# Altium footprint library PcbLib_ICs.PcbLib: 317 footprints (part 23 of 24) (continued)
## VQFN-24 [mm] "VQFN-24 package 5.5x3.5mm with 0.5mm pitch"
height 0.75
pads (25):
  rect 0.25x0.6 smd paste+0 mask+0.05: 1(-0.75,2.65)
  rrect50% 0.6x0.25 smd paste+0 mask+0.05: 2(-1.65,2.25) 3(-1.65,1.75) 4(-1.65,1.25) 5(-1.65,0.75) 6(-1.65,0.25) 7(-1.65,-0.25) 8(-1.65,-0.75) 9(-1.65,-1.25) 10(-1.65,-1.75) 11(-1.65,-2.25) 14(1.65,-2.25) 15(1.65,-1.75) 16(1.65,-1.25) 17(1.65,-0.75) 18(1.65,-0.25) 19(1.65,0.25) 20(1.65,0.75) 21(1.65,1.25) 22(1.65,1.75) 23(1.65,2.25)
  rrect50% 0.25x0.6 smd paste+0 mask+0.05: 12(-0.75,-2.65) 13(0.75,-2.65) 24(0.75,2.65)
  rrect5% 2.05x4.05 smd paste-10 mask+0.05: EP(0,0)
via 0.545,-1.498 diameter 0.7 hole 0.3
via -0.55,-1.5 diameter 0.7 hole 0.3
via -0.55,1.5 diameter 0.7 hole 0.3
via 0.55,1.5 diameter 0.7 hole 0.3
via 0.545,-0.748 diameter 0.7 hole 0.3
via -0.55,-0.75 diameter 0.7 hole 0.3
via 0.55,0.75 diameter 0.7 hole 0.3
via -0.55,0.75 diameter 0.7 hole 0.3
via 0,0 diameter 0.7 hole 0.3
Top Layer:
  region: 0.375,-2.9 0.375,-2.91 0.367,-2.928 0.353,-2.942 0.335,-2.95 0.325,-2.95 0.225,-2.95 0.215,-2.95 0.197,-2.942 0.183,-2.928 0.175,-2.91 0.175,-2.9 0.175,-2.475 0.174,-2.465 0.167,-2.447 0.153,-2.433 0.135,-2.426 0.125,-2.425 -0.125,-2.425 -0.135,-2.426 -0.153,-2.433 -0.167,-2.447 -0.174,-2.465 -0.175,-2.475 -0.175,-2.9 -0.175,-2.91 -0.183,-2.928 -0.197,-2.942 -0.215,-2.95 -0.225,-2.95 -0.325,-2.95 -0.335,-2.95 -0.353,-2.942 -0.367,-2.928 -0.375,-2.91 -0.375,-2.9 -0.375,-2.075 -0.376,-2.065 -0.383,-2.047 -0.397,-2.033 -0.415,-2.026 -0.425,-2.025 -0.425,-1.95 0.425,-1.95 0.425,-2.025 0.415,-2.026 0.397,-2.033 0.383,-2.047 0.376,-2.065 0.375,-2.075
  region: -0.375,2.9 -0.375,2.91 -0.367,2.928 -0.353,2.942 -0.335,2.95 -0.325,2.95 -0.225,2.95 -0.215,2.95 -0.197,2.942 -0.183,2.928 -0.175,2.91 -0.175,2.9 -0.175,2.475 -0.174,2.465 -0.167,2.447 -0.153,2.433 -0.135,2.426 -0.125,2.425 0.125,2.425 0.135,2.426 0.153,2.433 0.167,2.447 0.174,2.465 0.175,2.475 0.175,2.9 0.175,2.91 0.183,2.928 0.197,2.942 0.215,2.95 0.225,2.95 0.325,2.95 0.335,2.95 0.353,2.942 0.367,2.928 0.375,2.91 0.375,2.9 0.375,2.075 0.376,2.065 0.383,2.047 0.397,2.033 0.415,2.026 0.425,2.025 0.425,1.95 -0.425,1.95 -0.425,2.025 -0.415,2.026 -0.397,2.033 -0.383,2.047 -0.376,2.065 -0.375,2.075
Top Overlay:
  circle w0.25: c-1.65,3.5 r0.125
  lines w0.2: -2,-2.7 -2,-3 -1.2,-3 ; -2,2.7 -2,3 -1.2,3 ; 1.2,-3 2,-3 2,-2.7 ; 1.2,3 2,3 2,2.7
Top Paste:
  rectangle: -0.25,0.1 0.25,0.6
  rectangle: 0.45,0.1 0.95,0.6
  region: -0.45,0.6 -0.95,0.6 -0.95,0.1 -0.45,0.1
  rectangle: -0.25,0.8 0.25,1.3
  rectangle: 0.45,0.8 0.95,1.3
  region: -0.45,1.3 -0.95,1.3 -0.95,0.8 -0.45,0.8
  rectangle: -0.25,1.5 0.25,2
  rectangle: 0.45,1.5 0.95,2
  region: -0.45,2 -0.95,2 -0.95,1.5 -0.45,1.5
  region: 0.25,-0.1 -0.25,-0.1 -0.25,-0.6 0.25,-0.6
  region: -0.45,-0.1 -0.95,-0.1 -0.95,-0.6 -0.45,-0.6
  rectangle: 0.45,-0.6 0.95,-0.1
  region: 0.25,-0.8 -0.25,-0.8 -0.25,-1.3 0.25,-1.3
  region: -0.45,-0.8 -0.95,-0.8 -0.95,-1.3 -0.45,-1.3
  rectangle: 0.45,-1.3 0.95,-0.8
  region: 0.25,-1.5 -0.25,-1.5 -0.25,-2 0.25,-2
  region: -0.45,-1.5 -0.95,-1.5 -0.95,-2 -0.45,-2
  rectangle: 0.45,-2 0.95,-1.5
  region: -0.375,-2.9 -0.375,-2.91 -0.367,-2.928 -0.353,-2.942 -0.335,-2.95 -0.325,-2.95 -0.225,-2.95 -0.215,-2.95 -0.197,-2.942 -0.183,-2.928 -0.175,-2.91 -0.175,-2.9 -0.175,-2.4 -0.175,-2.39 -0.183,-2.372 -0.197,-2.358 -0.215,-2.35 -0.225,-2.35 -0.325,-2.35 -0.335,-2.35 -0.353,-2.358 -0.367,-2.372 -0.375,-2.39 -0.375,-2.4
  region: 0.375,-2.9 0.375,-2.91 0.367,-2.928 0.353,-2.942 0.335,-2.95 0.325,-2.95 0.225,-2.95 0.215,-2.95 0.197,-2.942 0.183,-2.928 0.175,-2.91 0.175,-2.9 0.175,-2.4 0.175,-2.39 0.183,-2.372 0.197,-2.358 0.215,-2.35 0.225,-2.35 0.325,-2.35 0.335,-2.35 0.353,-2.358 0.367,-2.372 0.375,-2.39 0.375,-2.4
  region: 0.375,2.9 0.375,2.91 0.367,2.928 0.353,2.942 0.335,2.95 0.325,2.95 0.225,2.95 0.215,2.95 0.197,2.942 0.183,2.928 0.175,2.91 0.175,2.9 0.175,2.4 0.175,2.39 0.183,2.372 0.197,2.358 0.215,2.35 0.225,2.35 0.325,2.35 0.335,2.35 0.353,2.358 0.367,2.372 0.375,2.39 0.375,2.4
  region: -0.375,2.9 -0.375,2.91 -0.367,2.928 -0.353,2.942 -0.335,2.95 -0.325,2.95 -0.225,2.95 -0.215,2.95 -0.197,2.942 -0.183,2.928 -0.175,2.91 -0.175,2.9 -0.175,2.4 -0.175,2.39 -0.183,2.372 -0.197,2.358 -0.215,2.35 -0.225,2.35 -0.325,2.35 -0.335,2.35 -0.353,2.358 -0.367,2.372 -0.375,2.39 -0.375,2.4
Top Solder:
  region: 0.225,-3 0.205,-3 0.168,-2.985 0.14,-2.957 0.125,-2.92 0.125,-2.9 0.125,-2.5 0.125,-2.495 0.121,-2.486 0.114,-2.479 0.105,-2.475 0.1,-2.475 -0.1,-2.475 -0.105,-2.475 -0.114,-2.479 -0.121,-2.486 -0.125,-2.495 -0.125,-2.5 -0.125,-2.9 -0.125,-2.92 -0.14,-2.957 -0.168,-2.985 -0.205,-3 -0.225,-3 -0.35,-3 -0.365,-3 -0.392,-2.989 -0.414,-2.967 -0.425,-2.94 -0.425,-2.925 -0.425,-2.15 -0.426,-2.135 -0.438,-2.108 -0.458,-2.088 -0.485,-2.076 -0.5,-2.075 -0.5,-2 0.5,-2 0.501,-2.075 0.486,-2.076 0.459,-2.087 0.438,-2.108 0.426,-2.135 0.425,-2.15 0.425,-2.925 0.425,-2.94 0.414,-2.967 0.392,-2.989 0.365,-3 0.35,-3
  region: -0.225,3 -0.205,3 -0.168,2.985 -0.14,2.957 -0.125,2.92 -0.125,2.9 -0.125,2.5 -0.125,2.495 -0.121,2.486 -0.114,2.479 -0.105,2.475 -0.1,2.475 0.1,2.475 0.105,2.475 0.114,2.479 0.121,2.486 0.125,2.495 0.125,2.5 0.125,2.9 0.125,2.92 0.14,2.957 0.168,2.985 0.205,3 0.225,3 0.35,3 0.365,3 0.392,2.989 0.414,2.967 0.425,2.94 0.425,2.925 0.425,2.15 0.426,2.135 0.438,2.108 0.458,2.088 0.485,2.076 0.5,2.075 0.5,2 -0.5,2 -0.501,2.075 -0.486,2.076 -0.459,2.087 -0.438,2.108 -0.426,2.135 -0.425,2.15 -0.425,2.925 -0.425,2.94 -0.414,2.967 -0.392,2.989 -0.365,3 -0.35,3
Bottom Solder:
  region: -1.2,2 -0.3,2 0,1.7 0.3,2 1.2,2 1.2,0.3 0.9,0 1.2,-0.3 1.2,-2 0.3,-2 0,-1.7 -0.3,-2 -1.2,-2 -1.2,-0.3 -0.9,0 -1.2,0.3
Top Assy:
  circle w0.05: c-1.25,2.248 r0.25
  lines w0.05: -1.75,-2.4 -1.76,-2.4 -1.76,-2.1 -1.75,-2.1 ; -1.75,-1.9 -1.76,-1.9 -1.76,-1.6 -1.75,-1.6 ; -1.75,-1.4 -1.76,-1.4 -1.76,-1.1 -1.75,-1.1 ; -1.75,-0.9 -1.76,-0.9 -1.76,-0.6 -1.75,-0.6 ; -1.75,-0.4 -1.76,-0.4 -1.76,-0.1 -1.75,-0.1 ; -1.75,0.1 -1.76,0.1 -1.76,0.4 -1.75,0.4 ; -1.75,0.6 -1.76,0.6 -1.76,0.9 -1.75,0.9 ; -1.75,1.1 -1.76,1.1 -1.76,1.4 -1.75,1.4 ; -1.75,1.6 -1.76,1.6 -1.76,1.9 -1.75,1.9 ; -1.75,2.1 -1.76,2.1 -1.76,2.4 -1.75,2.4 ; -1.45,-2.75 -1.45,-2.76 -1.2,-2.76 -1.2,-2.75 ; -1.45,2.75 -1.45,2.76 -1.2,2.76 -1.2,2.75 ; -0.9,-2.75 -0.9,-2.76 -0.6,-2.76 -0.6,-2.75 ; -0.9,2.75 -0.9,2.76 -0.6,2.76 -0.6,2.75 ; -0.375,-2.75 -0.375,-2.76 -0.175,-2.76 -0.175,-2.75 ; -0.375,2.75 -0.375,2.76 -0.175,2.76 -0.175,2.75 ; 0.175,-2.75 0.175,-2.76 0.375,-2.76 0.375,-2.75 ; 0.175,2.75 0.175,2.76 0.375,2.76 0.375,2.75 ; 0.6,-2.75 0.6,-2.76 0.9,-2.76 0.9,-2.75 ; 0.6,2.75 0.6,2.76 0.9,2.76 0.9,2.75 ; 1.2,-2.75 1.2,-2.76 1.45,-2.76 1.45,-2.75 ; 1.2,2.75 1.2,2.76 1.45,2.76 1.45,2.75 ; 1.75,-2.4 1.76,-2.4 1.76,-2.1 1.75,-2.1 ; 1.75,-1.9 1.76,-1.9 1.76,-1.6 1.75,-1.6 ; 1.75,-1.4 1.76,-1.4 1.76,-1.1 1.75,-1.1 ; 1.75,-0.9 1.76,-0.9 1.76,-0.6 1.75,-0.6 ; 1.75,-0.4 1.76,-0.4 1.76,-0.1 1.75,-0.1 ; 1.75,0.1 1.76,0.1 1.76,0.4 1.75,0.4 ; 1.75,0.6 1.76,0.6 1.76,0.9 1.75,0.9 ; 1.75,1.1 1.76,1.1 1.76,1.4 1.75,1.4 ; 1.75,1.6 1.76,1.6 1.76,1.9 1.75,1.9 ; 1.75,2.1 1.76,2.1 1.76,2.4 1.75,2.4 ; -1.75,-2.75 -1.75,2.75 1.75,2.75 1.75,-2.75 -1.75,-2.75
  text ".Designator" at 0.467,-3.443 h2
Top Text:
  lines w0.05: -2.1,-3.1 -2.1,3.1 2.1,3.1 2.1,-3.1 -2.1,-3.1
  lines w0.1: -0.5,0 0.5,0 ; 0,-0.5 0,0.5
3D body "VQFN-24.STEP": height 1, standoff 0, extent -1.76,-2.76 1.76,2.76

## VQFN-64_5LX [mm] "QFN64 9mm x 9mm, 0.5mm pitch"
height 1
pads (65):
  rect 0.95x0.25 smd paste+0 mask+0.05: 1(-4.45,3.75)
  oval 0.95x0.25 smd paste+0 mask+0.05: 2(-4.45,3.25) 3(-4.45,2.75) 4(-4.45,2.25) 5(-4.45,1.75) 6(-4.45,1.25) 7(-4.45,0.75) 8(-4.45,0.25) 9(-4.45,-0.25) 10(-4.45,-0.75) 11(-4.45,-1.25) 12(-4.45,-1.75) 13(-4.45,-2.25) 14(-4.45,-2.75) 15(-4.45,-3.25) 16(-4.45,-3.75) 33(4.45,-3.75) 34(4.45,-3.25) 35(4.45,-2.75) 36(4.45,-2.25) 37(4.45,-1.75) 38(4.45,-1.25) 39(4.45,-0.75) 40(4.45,-0.25) 41(4.45,0.25) 42(4.45,0.75) 43(4.45,1.25) 44(4.45,1.75) 45(4.45,2.25) 46(4.45,2.75) 47(4.45,3.25) 48(4.45,3.75)
  oval 0.25x0.95 smd paste+0 mask+0.05: 17(-3.75,-4.45) 18(-3.25,-4.45) 19(-2.75,-4.45) 20(-2.25,-4.45) 21(-1.75,-4.45) 22(-1.25,-4.45) 23(-0.75,-4.45) 24(-0.25,-4.45) 25(0.25,-4.45) 26(0.75,-4.45) 27(1.25,-4.45) 28(1.75,-4.45) 29(2.25,-4.45) 30(2.75,-4.45) 31(3.25,-4.45) 32(3.75,-4.45) 49(3.75,4.45) 50(3.25,4.45) 51(2.75,4.45) 52(2.25,4.45) 53(1.75,4.45) 54(1.25,4.45) 55(0.75,4.45) 56(0.25,4.45) 57(-0.25,4.45) 58(-0.75,4.45) 59(-1.25,4.45) 60(-1.75,4.45) 61(-2.25,4.45) 62(-2.75,4.45) 63(-3.25,4.45) 64(-3.75,4.45)
  rrect5% 5.5x5.5 smd paste-50 mask+0.05: EP(0,0)
via 0,-1.2 diameter 0.7 hole 0.3
via -1.2,-1.2 diameter 0.7 hole 0.3
via -2.4,-1.2 diameter 0.7 hole 0.3
via -2.4,-2.4 diameter 0.7 hole 0.3
via -1.2,-2.4 diameter 0.7 hole 0.3
via 0,-2.4 diameter 0.7 hole 0.3
via 2.4,-1.2 diameter 0.7 hole 0.3
via 1.2,-1.2 diameter 0.7 hole 0.3
via 1.2,-2.4 diameter 0.7 hole 0.3
via 2.4,-2.4 diameter 0.7 hole 0.3
via 2.4,2.4 diameter 0.7 hole 0.3
via 1.2,2.4 diameter 0.7 hole 0.3
via 1.2,1.2 diameter 0.7 hole 0.3
via 2.4,1.2 diameter 0.7 hole 0.3
via 1.2,0 diameter 0.7 hole 0.3
via 2.4,0 diameter 0.7 hole 0.3
via 0,2.4 diameter 0.7 hole 0.3
via -1.2,2.4 diameter 0.7 hole 0.3
via -2.4,2.4 diameter 0.7 hole 0.3
via -2.4,1.2 diameter 0.7 hole 0.3
via -1.2,1.2 diameter 0.7 hole 0.3
via 0,1.2 diameter 0.7 hole 0.3
via -2.4,0 diameter 0.7 hole 0.3
via -1.2,0 diameter 0.7 hole 0.3
via 0,0 diameter 0.7 hole 0.3
Top Overlay:
  circle w0.25: c-5.375,4.575 r0.125
  lines w0.2: -4.725,-4.275 -4.725,-4.725 -4.275,-4.725 ; -4.725,4.275 -4.725,4.725 -4.275,4.725 ; 4.275,-4.725 4.725,-4.725 4.725,-4.275 ; 4.275,4.725 4.725,4.725 4.725,4.275
Top Paste:
  region: 1.5,-0.8 1.5,-1.3 2,-1.3 2,-0.8
  region: 0.8,-0.8 0.8,-1.3 1.3,-1.3 1.3,-0.8
  region: 1.3,-2 1.3,-1.5 0.8,-1.5 0.8,-2
  region: 2,-2 2,-1.5 1.5,-1.5 1.5,-2
  region: -1.3,-0.8 -1.3,-1.3 -0.8,-1.3 -0.8,-0.8
  region: -2,-0.8 -2,-1.3 -1.5,-1.3 -1.5,-0.8
  region: -1.5,-2 -1.5,-1.5 -2,-1.5 -2,-2
  region: -0.8,-2 -0.8,-1.5 -1.3,-1.5 -1.3,-2
  region: 0.1,-0.8 0.1,-1.3 0.6,-1.3 0.6,-0.8
  region: -0.6,-0.8 -0.6,-1.3 -0.1,-1.3 -0.1,-0.8
  region: -0.1,-2 -0.1,-1.5 -0.6,-1.5 -0.6,-2
  region: 0.6,-2 0.6,-1.5 0.1,-1.5 0.1,-2
  region: 1.5,2 1.5,1.5 2,1.5 2,2
  region: 0.8,2 0.8,1.5 1.3,1.5 1.3,2
  region: 1.3,0.8 1.3,1.3 0.8,1.3 0.8,0.8
  region: 2,0.8 2,1.3 1.5,1.3 1.5,0.8
  region: -1.3,2 -1.3,1.5 -0.8,1.5 -0.8,2
  region: -2,2 -2,1.5 -1.5,1.5 -1.5,2
  region: -1.5,0.8 -1.5,1.3 -2,1.3 -2,0.8
  region: -0.8,0.8 -0.8,1.3 -1.3,1.3 -1.3,0.8
  region: 0.1,2 0.1,1.5 0.6,1.5 0.6,2
  region: -0.6,2 -0.6,1.5 -0.1,1.5 -0.1,2
  region: -0.1,0.8 -0.1,1.3 -0.6,1.3 -0.6,0.8
  region: 0.6,0.8 0.6,1.3 0.1,1.3 0.1,0.8
  region: 1.5,0.6 1.5,0.1 2,0.1 2,0.6
  region: 0.8,0.6 0.8,0.1 1.3,0.1 1.3,0.6
  region: 1.3,-0.6 1.3,-0.1 0.8,-0.1 0.8,-0.6
  region: 2,-0.6 2,-0.1 1.5,-0.1 1.5,-0.6
  region: -1.3,0.6 -1.3,0.1 -0.8,0.1 -0.8,0.6
  region: -2,0.6 -2,0.1 -1.5,0.1 -1.5,0.6
  region: -1.5,-0.6 -1.5,-0.1 -2,-0.1 -2,-0.6
  region: -0.8,-0.6 -0.8,-0.1 -1.3,-0.1 -1.3,-0.6
  region: 0.1,0.6 0.1,0.1 0.6,0.1 0.6,0.6
  region: -0.6,0.6 -0.6,0.1 -0.1,0.1 -0.1,0.6
  region: -0.1,-0.6 -0.1,-0.1 -0.6,-0.1 -0.6,-0.6
  region: 0.6,-0.6 0.6,-0.1 0.1,-0.1 0.1,-0.6
Bottom Solder:
  region: -3,3 -0.2,3 0,2.8 0.2,3 3,3.001 3,0.2 2.8,0 3,-0.2 3,-3 0.2,-3 0,-2.8 -0.2,-3 -3,-3 -3,-0.2 -2.8,0 -3,0.2
Top Assy:
  drawing of 197 lines, arcs and shapes, not listed
  text ".Designator" at -3.443,-0.467 h2
Top Text:
  lines w0.05: -4.875,-4.875 -4.875,4.875 4.875,4.875 4.875,-4.875 -4.875,-4.875
  lines w0.1: -0.5,0 0.5,0 ; 0,-0.5 0,0.5
3D body "VQFN64_5LX.SLDPRT": height 1, standoff 0, extent -4.52,-4.52 4.52,4.52

## VQFN-64_R4X [mm] "QFN64 9mm x 9mm, 0.5mm pitch"
height 1
pads (65):
  rect 0.95x0.25 smd paste+0 mask+0.05: 1(-4.5,3.75)
  oval 0.95x0.25 smd paste+0 mask+0.05: 2(-4.5,3.25) 3(-4.5,2.75) 4(-4.5,2.25) 5(-4.5,1.75) 6(-4.5,1.25) 7(-4.5,0.75) 8(-4.5,0.25) 9(-4.5,-0.25) 10(-4.5,-0.75) 11(-4.5,-1.25) 12(-4.5,-1.75) 13(-4.5,-2.25) 14(-4.5,-2.75) 15(-4.5,-3.25) 16(-4.5,-3.75) 33(4.5,-3.75) 34(4.5,-3.25) 35(4.5,-2.75) 36(4.5,-2.25) 37(4.5,-1.75) 38(4.5,-1.25) 39(4.5,-0.75) 40(4.5,-0.25) 41(4.5,0.25) 42(4.5,0.75) 43(4.5,1.25) 44(4.5,1.75) 45(4.5,2.25) 46(4.5,2.75) 47(4.5,3.25) 48(4.5,3.75)
  oval 0.25x0.95 smd paste+0 mask+0.05: 17(-3.75,-4.5) 18(-3.25,-4.5) 19(-2.75,-4.5) 20(-2.25,-4.5) 21(-1.75,-4.5) 22(-1.25,-4.5) 23(-0.75,-4.5) 24(-0.25,-4.5) 25(0.25,-4.5) 26(0.75,-4.5) 27(1.25,-4.5) 28(1.75,-4.5) 29(2.25,-4.5) 30(2.75,-4.5) 31(3.25,-4.5) 32(3.75,-4.5) 49(3.75,4.5) 50(3.25,4.5) 51(2.75,4.5) 52(2.25,4.5) 53(1.75,4.5) 54(1.25,4.5) 55(0.75,4.5) 56(0.25,4.5) 57(-0.25,4.5) 58(-0.75,4.5) 59(-1.25,4.5) 60(-1.75,4.5) 61(-2.25,4.5) 62(-2.75,4.5) 63(-3.25,4.5) 64(-3.75,4.5)
  rrect5% 7.25x7.25 smd paste-50 mask+0.05: EP(0,0)
via -0.6,0.6 diameter 0.7 hole 0.3
via -1.8,0.6 diameter 0.7 hole 0.3
via -3,0.6 diameter 0.7 hole 0.3
via -0.6,1.8 diameter 0.7 hole 0.3
via -1.8,1.8 diameter 0.7 hole 0.3
via -3,1.8 diameter 0.7 hole 0.3
via -3,3 diameter 0.7 hole 0.3
via -1.8,3 diameter 0.7 hole 0.3
via -0.6,3 diameter 0.7 hole 0.3
via 3,0.6 diameter 0.7 hole 0.3
via 1.8,0.6 diameter 0.7 hole 0.3
via 0.6,0.6 diameter 0.7 hole 0.3
via 3,1.8 diameter 0.7 hole 0.3
via 1.8,1.8 diameter 0.7 hole 0.3
via 0.6,1.8 diameter 0.7 hole 0.3
via 0.6,3 diameter 0.7 hole 0.3
via 1.8,3 diameter 0.7 hole 0.3
via 3,3 diameter 0.7 hole 0.3
via 3,-3 diameter 0.7 hole 0.3
via 1.8,-3 diameter 0.7 hole 0.3
via 0.6,-3 diameter 0.7 hole 0.3
via 3,-1.8 diameter 0.7 hole 0.3
via 1.8,-1.8 diameter 0.7 hole 0.3
via 0.6,-1.8 diameter 0.7 hole 0.3
via 0.6,-0.6 diameter 0.7 hole 0.3
via 1.8,-0.6 diameter 0.7 hole 0.3
via 3,-0.6 diameter 0.7 hole 0.3
via -0.6,-3 diameter 0.7 hole 0.3
via -1.8,-3 diameter 0.7 hole 0.3
via -3,-3 diameter 0.7 hole 0.3
via -0.6,-1.8 diameter 0.7 hole 0.3
via -1.8,-1.8 diameter 0.7 hole 0.3
via -3,-1.8 diameter 0.7 hole 0.3
via -3,-0.6 diameter 0.7 hole 0.3
via -1.8,-0.6 diameter 0.7 hole 0.3
via -0.6,-0.6 diameter 0.7 hole 0.3
Top Overlay:
  circle w0.25: c-5.375,4.575 r0.125
  lines w0.2: -4.725,-4.275 -4.725,-4.725 -4.275,-4.725 ; -4.725,4.275 -4.725,4.725 -4.275,4.725 ; 4.275,-4.725 4.725,-4.725 4.725,-4.275 ; 4.275,4.725 4.725,4.725 4.725,4.275
Top Paste:
  region: 0.6,-0.6 0.6,-0.1 0.1,-0.1 0.1,-0.6
  region: -0.1,-0.6 -0.1,-0.1 -0.6,-0.1 -0.6,-0.6
  region: -0.6,0.6 -0.6,0.1 -0.1,0.1 -0.1,0.6
  region: 0.1,0.6 0.1,0.1 0.6,0.1 0.6,0.6
  region: -0.8,-0.6 -0.8,-0.1 -1.3,-0.1 -1.3,-0.6
  region: -1.5,-0.6 -1.5,-0.1 -2,-0.1 -2,-0.6
  region: -2,0.6 -2,0.1 -1.5,0.1 -1.5,0.6
  region: -1.3,0.6 -1.3,0.1 -0.8,0.1 -0.8,0.6
  region: 2,-0.6 2,-0.1 1.5,-0.1 1.5,-0.6
  region: 1.3,-0.6 1.3,-0.1 0.8,-0.1 0.8,-0.6
  region: 0.8,0.6 0.8,0.1 1.3,0.1 1.3,0.6
  region: 1.5,0.6 1.5,0.1 2,0.1 2,0.6
  region: 0.6,0.8 0.6,1.3 0.1,1.3 0.1,0.8
  region: -0.1,0.8 -0.1,1.3 -0.6,1.3 -0.6,0.8
  region: -0.6,2 -0.6,1.5 -0.1,1.5 -0.1,2
  region: 0.1,2 0.1,1.5 0.6,1.5 0.6,2
  region: -0.8,0.8 -0.8,1.3 -1.3,1.3 -1.3,0.8
  region: -1.5,0.8 -1.5,1.3 -2,1.3 -2,0.8
  region: -2,2 -2,1.5 -1.5,1.5 -1.5,2
  region: -1.3,2 -1.3,1.5 -0.8,1.5 -0.8,2
  region: 2,0.8 2,1.3 1.5,1.3 1.5,0.8
  region: 1.3,0.8 1.3,1.3 0.8,1.3 0.8,0.8
  region: 0.8,2 0.8,1.5 1.3,1.5 1.3,2
  region: 1.5,2 1.5,1.5 2,1.5 2,2
  region: 0.6,-2 0.6,-1.5 0.1,-1.5 0.1,-2
  region: -0.1,-2 -0.1,-1.5 -0.6,-1.5 -0.6,-2
  region: -0.6,-0.8 -0.6,-1.3 -0.1,-1.3 -0.1,-0.8
  region: 0.1,-0.8 0.1,-1.3 0.6,-1.3 0.6,-0.8
  region: -0.8,-2 -0.8,-1.5 -1.3,-1.5 -1.3,-2
  region: -1.5,-2 -1.5,-1.5 -2,-1.5 -2,-2
  region: -2,-0.8 -2,-1.3 -1.5,-1.3 -1.5,-0.8
  region: -1.3,-0.8 -1.3,-1.3 -0.8,-1.3 -0.8,-0.8
  region: 2,-2 2,-1.5 1.5,-1.5 1.5,-2
  region: 1.3,-2 1.3,-1.5 0.8,-1.5 0.8,-2
  region: 0.8,-0.8 0.8,-1.3 1.3,-1.3 1.3,-0.8
  region: 1.5,-0.8 1.5,-1.3 2,-1.3 2,-0.8
Bottom Solder:
  region: -3.5,3.5 -0.4,3.5 0,3.1 0.4,3.5 3.5,3.501 3.5,0.4 3.1,0 3.499,-0.4 3.499,-3.5 0.4,-3.5 0,-3.1 -0.4,-3.5 -3.5,-3.499 -3.5,-0.4 -3.1,0 -3.5,0.4
Top Assy:
  drawing of 197 lines, arcs and shapes, not listed
  text ".Designator" at -3.443,-0.467 h2
Top Text:
  lines w0.05: -4.875,-4.875 4.875,-4.875 4.875,4.875 -4.875,4.875 -4.875,-4.875
  lines w0.1: -0.5,0 0.5,0 ; 0,-0.5 0,0.5
3D body "VQFN64_R4X.STEP": height 0.9, standoff 0, extent -4.52,-4.52 4.52,4.52

## VQFN-HR-11 [mm] "VQFN-HR-11 package with 0.5mm pitch"
height 0.75
pads (11):
  rect 2.6x0.25 smd paste-3 mask+0.05: 1(0,0.5)
  rrect50% 2.6x0.25 smd paste-3 mask+0.05: 2(0,0) 3(0,-0.5)
  rrect50% 0.25x0.7 smd paste+0 mask+0.05: 4(-0.75,-1.45) 5(-0.25,-1.45) 6(0.25,-1.45) 7(0.75,-1.45) 8(0.75,1.45) 9(0.25,1.45) 10(-0.25,1.45) 11(-0.75,1.45)
Top Overlay:
  circle w0.25: c-1.6,0.5 r0.125
  lines w0.2: -1.3,-1.5 -1.3,-1.1 ; -1.3,1.1 -1.3,1.5 ; 1.3,-1.5 1.3,-1.1 ; 1.3,1.1 1.3,1.5
Top Paste:
  rectangle: -0.325,-0.15 0.325,0.15
  rectangle: 0.535,-0.15 1.185,0.15
  rectangle: -1.185,-0.15 -0.535,0.15
  rectangle: -0.325,0.35 0.325,0.65
  rectangle: 0.535,0.35 1.185,0.65
  rectangle: -1.185,0.35 -0.535,0.65
  rectangle: -0.325,-0.65 0.325,-0.35
  rectangle: 0.535,-0.65 1.185,-0.35
  rectangle: -1.185,-0.65 -0.535,-0.35
Top Assy:
  circle w0.05: c-0.7,1.2 r0.15
  lines w0.05: -1,-0.625 -1.025,-0.625 -1.025,-0.375 -1,-0.375 ; -1,-0.125 -1.025,-0.125 -1.025,0.125 -1,0.125 ; -1,0.375 -1.025,0.375 -1.025,0.625 -1,0.625 ; -0.875,-1.5 -0.875,-1.525 -0.625,-1.525 -0.625,-1.5 ; -0.875,1.5 -0.875,1.525 -0.625,1.525 -0.625,1.5 ; -0.375,-1.5 -0.375,-1.525 -0.125,-1.525 -0.125,-1.5 ; -0.375,1.5 -0.375,1.525 -0.125,1.525 -0.125,1.5 ; 0.125,-1.5 0.125,-1.525 0.375,-1.525 0.375,-1.5 ; 0.125,1.5 0.125,1.525 0.375,1.525 0.375,1.5 ; 0.625,-1.5 0.625,-1.525 0.875,-1.525 0.875,-1.5 ; 0.625,1.5 0.625,1.525 0.875,1.525 0.875,1.5 ; 1,-0.625 1.025,-0.625 1.025,-0.375 1,-0.375 ; 1,-0.125 1.025,-0.125 1.025,0.125 1,0.125 ; 1,0.375 1.025,0.375 1.025,0.625 1,0.625 ; -1,-1.5 1,-1.5 1,1.5 -1,1.5 -1,-1.5
  text ".Designator" at 0.467,-3.443 h2
Top Text:
  lines w0.1: -0.5,0 0.5,0 ; 0,-0.5 0,0.5
3D body "VQFN-HR-11.STEP": height 1, standoff 0, extent -1.025,-1.525 1.025,1.525

## VSON-10 [mm] "VSON-10 package 3 x 3mm with 0.5mm pitch"
height 1
pads (15):
  rrect50% 0.6x0.25 smd paste+0 mask+0.05: 1(-1.4,1) 2(-1.4,0.5) 3(-1.4,0) 4(-1.4,-0.5) 5(-1.4,-1) 6(1.4,-1) 7(1.4,-0.5) 8(1.4,0) 9(1.4,0.5) 10(1.4,1)
  rrect50% 0.25x0.6 smd paste+0 mask+0.05: EP(-0.25,-1.4) EP(-0.25,1.4) EP(0.25,-1.4) EP(0.25,1.4)
  rrect10% 1.65x2.4 smd paste-50 mask+0.05: EP(0,0)
via 0,-0.95 diameter 0.5 hole 0.2
via 0,0.95 diameter 0.5 hole 0.2
via 0,0 diameter 0.5 hole 0.2
via -0.575,0.575 diameter 0.5 hole 0.2
via -0.575,-0.575 diameter 0.5 hole 0.2
via 0.575,-0.575 diameter 0.5 hole 0.2
via 0.575,0.575 diameter 0.5 hole 0.2
Top Overlay:
  circle w0.25: c-2.2,1.5 r0.125
  lines w0.2: -1.7,-1.4 -1.7,-1.7 -1.4,-1.7 ; -1.7,1.4 -1.7,1.7 -1.4,1.7 ; 1.4,-1.7 1.7,-1.7 1.7,-1.4 ; 1.4,1.7 1.7,1.7 1.7,1.4
Top Paste:
  region: 0.1,-0.45 0.1,-0.95 0.7,-0.95 0.7,-0.45
  region: 0.1,0.25 0.1,-0.25 0.7,-0.25 0.7,0.25
  region: 0.1,0.95 0.1,0.45 0.7,0.45 0.7,0.95
  region: -0.1,-0.45 -0.7,-0.45 -0.7,-0.95 -0.1,-0.95
  region: -0.1,0.95 -0.7,0.95 -0.7,0.45 -0.1,0.45
  region: -0.1,0.25 -0.7,0.25 -0.7,-0.25 -0.1,-0.25
Bottom Solder:
  region: -1,1.2 -0.3,1.2 0,0.9 0.3,1.2 1,1.2 1,0.3 0.7,0 1,-0.3 1,-1.2 0.3,-1.2 0,-0.9 -0.3,-1.2 -1,-1.2 -1,-0.3 -0.7,0 -1,0.3
Top Assy:
  circle w0.05: c-1.2,1.2 r0.2
  lines w0.05: -1.601,-1.1 -1.671,-1.1 -1.671,-0.9 -1.601,-0.9 ; -1.601,-0.6 -1.671,-0.6 -1.671,-0.4 -1.601,-0.4 ; -1.601,-0.1 -1.671,-0.1 -1.671,0.1 -1.601,0.1 ; -1.601,0.4 -1.671,0.4 -1.671,0.6 -1.601,0.6 ; -1.601,0.9 -1.671,0.9 -1.671,1.1 -1.601,1.1 ; -0.35,-1.601 -0.35,-1.671 -0.15,-1.671 -0.15,-1.601 ; -0.35,1.601 -0.35,1.671 -0.15,1.671 -0.15,1.601 ; 0.15,-1.601 0.15,-1.671 0.35,-1.671 0.35,-1.601 ; 0.15,1.601 0.15,1.671 0.35,1.671 0.35,1.601 ; 1.601,-1.1 1.671,-1.1 1.671,-0.9 1.601,-0.9 ; 1.601,-0.6 1.671,-0.6 1.671,-0.4 1.601,-0.4 ; 1.601,-0.1 1.671,-0.1 1.671,0.1 1.601,0.1 ; 1.601,0.4 1.671,0.4 1.671,0.6 1.601,0.6 ; 1.601,0.9 1.671,0.9 1.671,1.1 1.601,1.1 ; -1.6,-1.6 1.6,-1.6 1.6,1.6 -1.6,1.6 -1.6,-1.6
  text ".Designator" at -2.579,-0.349 h1.5
Top Text:
  lines w0.05: -1.6,-1.6 1.6,-1.6 1.6,1.6 -1.6,1.6 -1.6,-1.6
  lines w0.1: -0.5,0 0.5,0 ; 0,-0.5 0,0.5
3D body "TPS51200.STEP": height 1.08, standoff 0, extent -1.58,-1.58 1.58,1.58

## VSSOP-8_SM8 [mm] "VSSOP, 8-Leads, Body 2.30x2.00mm, Pitch 0.5mm, IPC Medium Density"
height 1.1
pads (8):
  rect 0.75x0.24 smd paste+0 mask+0.05: 1(-1.55,0.75)
  oval 0.75x0.24 smd paste+0 mask+0.05: 2(-1.55,0.25) 3(-1.55,-0.25) 4(-1.55,-0.75) 5(1.55,-0.75) 6(1.55,-0.25) 7(1.55,0.25) 8(1.55,0.75)
Top Overlay:
  circle w0.25: c-2.3,0.75 r0.1
  lines w0.2: -1.35,-1.1 -1.35,-1.25 1.35,-1.25 1.35,-1.1 ; -1.35,1.1 -1.35,1.25 1.35,1.25 1.35,1.1
Top Assy:
  circle w0.05: c-0.85,0.7 r0.15
  lines w0.05: -1.4,-0.9 -1.4,-0.6 ; -1.4,-0.4 -1.4,-0.1 ; -1.4,0.1 -1.4,0.4 ; -1.4,0.6 -1.4,0.9 ; -1.3,-0.9 -1.3,-0.6 ; -1.3,-0.4 -1.3,-0.1 ; -1.3,0.1 -1.3,0.4 ; -1.3,0.6 -1.3,0.9 ; 1.3,-0.9 1.3,-0.6 ; 1.3,-0.4 1.3,-0.1 ; 1.3,0.1 1.3,0.4 ; 1.3,0.6 1.3,0.9 ; 1.4,-0.9 1.4,-0.6 ; 1.4,-0.4 1.4,-0.1 ; 1.4,0.1 1.4,0.4 ; 1.4,0.6 1.4,0.9 ; -1.15,-1 -1.088,-0.938 ; -1.15,-1 -1.15,1 ; -1.15,-1 1.15,-1 ; -1.15,1 -1.088,0.938 ; -1.15,1 1.15,1 ; -1.088,-0.938 -1.088,0.938 ; -1.088,-0.938 1.088,-0.938 ; -1.088,0.938 1.088,0.938 ; 1.088,-0.938 1.088,0.938 ; 1.088,-0.938 1.15,-1 ; 1.088,0.938 1.15,1 ; 1.15,-1 1.15,1 ; -1.55,-0.9 -1.15,-0.9 -1.15,-0.6 -1.55,-0.6 -1.55,-0.9 ; -1.55,-0.4 -1.15,-0.4 -1.15,-0.1 -1.55,-0.1 -1.55,-0.4 ; -1.55,0.1 -1.15,0.1 -1.15,0.4 -1.55,0.4 -1.55,0.1 ; -1.55,0.6 -1.15,0.6 -1.15,0.9 -1.55,0.9 -1.55,0.6 ; 1.15,-0.9 1.55,-0.9 1.55,-0.6 1.15,-0.6 1.15,-0.9 ; 1.15,-0.4 1.55,-0.4 1.55,-0.1 1.15,-0.1 1.15,-0.4 ; 1.15,0.1 1.55,0.1 1.55,0.4 1.15,0.4 1.15,0.1 ; 1.15,0.6 1.55,0.6 1.55,0.9 1.15,0.9 1.15,0.6
  text ".Designator" at -2.064,-0.28 h1.2
Top Text:
  lines w0.1: -0.5,0 0.5,0 ; 0,-0.5 0,0.5
3D body "User Library-SOP50P310X90-8N[8US8_VSSOP_DCU_MO-187CA].step": height 0.9, standoff 0, extent -1.6,-1.05 1.6,1.05

## VSSOP-10 [mm] "TSOP, 10-Leads, Body 3.00x3.00mm, Pitch 0.5mm, IPC Medium Density"
height 1.1
pads (10):
  rect 1.45x0.3 smd paste+0 mask+0.05: 1(-2.2,1)
  oval 1.45x0.3 smd paste+0 mask+0.05: 2(-2.2,0.5) 3(-2.2,0) 4(-2.2,-0.5) 5(-2.2,-1) 6(2.2,-1) 7(2.2,-0.5) 8(2.2,0) 9(2.2,0.5) 10(2.2,1)
Top Overlay:
  circle w0.25: c-2.75,1.75 r0.125
  lines w0.2: -1.75,-1.4 -1.75,-1.725 1.75,-1.725 1.75,-1.4 ; -1.75,1.4 -1.75,1.725 1.75,1.725 1.75,1.4
Top Assy:
  drawing of 195 lines, arcs and shapes, not listed
  text ".Designator" at -2.579,-0.349 h1.5
Top Text:
  lines w0.05: -3.2,-1.8 3.2,-1.8 3.2,1.8 -3.2,1.8 -3.2,-1.8
  lines w0.1: -0.5,0 0.5,0 ; 0,-0.5 0,0.5
3D body "DGS0010A.STEP": height 1.1, standoff 0, extent -2.463,-1.5 2.463,1.5

## WDFN-6 [mm] "WDFN-6 package 2mm x 2mm with 0.65mm pitch"
height 0.8
pads (7):
  rect 0.7x0.3 smd paste+0 mask+0.05: 1(-1.125,0.65)
  oval 0.7x0.3 smd paste+0 mask+0.05: 2(-1.125,0) 3(-1.125,-0.65) 4(1.125,-0.65) 5(1.125,0) 6(1.125,0.65)
  rrect10% 1x1.6 smd paste-50 mask+0.05: EP(0,0)
Top Overlay:
  circle w0.15: c-1.55,1.125 r0.05
  lines w0.2: -1.2,-1.025 -1.2,-1.2 -0.875,-1.2 ; -1.2,1.025 -1.2,1.2 -0.875,1.2 ; 0.875,-1.2 1.2,-1.2 1.2,-1.025 ; 0.875,1.2 1.2,1.2 1.2,1.025
Top Paste:
  rectangle: 0.1,0.101 0.55,0.701
  rectangle: -0.55,0.101 -0.1,0.701
  region: -0.55,-0.099 -0.55,-0.699 -0.1,-0.699 -0.1,-0.099
  region: 0.1,-0.099 0.1,-0.699 0.55,-0.699 0.55,-0.099
Top Assy:
  circle w0.05: c-0.71,0.75 r0.15
  lines w0.05: -1.05,-0.75 -1.12,-0.75 -1.12,-0.55 -1.05,-0.55 ; -1.05,-0.1 -1.12,-0.1 -1.12,0.1 -1.05,0.1 ; -1.05,0.55 -1.12,0.55 -1.12,0.75 -1.05,0.75 ; 1.05,-0.75 1.12,-0.75 1.12,-0.55 1.05,-0.55 ; 1.05,-0.1 1.12,-0.1 1.12,0.1 1.05,0.1 ; 1.05,0.55 1.12,0.55 1.12,0.75 1.05,0.75 ; -1.05,-1.05 -1.05,1.05 1.05,1.05 1.05,-1.05 -1.05,-1.05
  text ".Designator" at -2.579,-0.349 h1.5
Top Text:
  lines w0.05: -1.35,-1.35 -1.35,1.35 1.35,1.35 1.35,-1.35 -1.35,-1.35
  lines w0.1: -0.5,0 0.5,0 ; 0,-0.5 0,0.5
3D body "WDFN-6.step": height 0.8, standoff 0, extent -1.13,-1.05 1.13,1.05

## WDFN-12L [mm] "DFN-12 package with 0.5mm pitch 3x4mm"
height 0.75
pads (13):
  rect 0.7x0.25 smd paste+0 mask+0.05: 1(-1.45,1.125)
  oval 0.7x0.25 smd paste+0 mask+0.05: 2(-1.45,0.675) 3(-1.45,0.225) 4(-1.45,-0.225) 5(-1.45,-0.675) 6(-1.45,-1.125) 7(1.45,-1.125) 8(1.45,-0.675) 9(1.45,-0.225) 10(1.45,0.225) 11(1.45,0.675) 12(1.45,1.125)
  rrect10% 1.8x2.8 smd paste-10 mask+0.05: EP(0,0)
via 0,0 diameter 0.7 hole 0.3
via -0.4,0.8 diameter 0.7 hole 0.3
via 0.4,0.8 diameter 0.7 hole 0.3
via 0.4,-0.8 diameter 0.7 hole 0.3
via -0.4,-0.8 diameter 0.7 hole 0.3
Top Overlay:
  circle w0.25: c-2.3,1.6 r0.1
  lines w0.2: -1.7,-1.5 -1.7,-1.7 1.7,-1.7 1.7,-1.5 ; -1.7,1.5 -1.7,1.7 1.7,1.7 1.7,1.5
Top Paste:
  region: 0.7,-0.5 0.1,-0.5 0.1,-1.1 0.7,-1.1
  region: -0.1,-0.5 -0.7,-0.5 -0.7,-1.1 -0.1,-1.1
  region: 0.7,0.3 0.1,0.3 0.1,-0.3 0.7,-0.3
  region: -0.1,0.3 -0.7,0.3 -0.7,-0.3 -0.1,-0.3
  rectangle: -0.7,0.5 -0.1,1.1
  rectangle: 0.1,0.5 0.7,1.1
Bottom Solder:
  region: -1,1.4 -0.3,1.4 0,1.1 0.3,1.4 1,1.4 1,0.3 0.7,0 1,-0.3 1,-1.4 0.3,-1.4 0,-1.1 -0.3,-1.4 -1,-1.4 -1,-0.3 -0.7,0 -1,0.3
Top Assy:
  circle w0.05: c-1.1,1.1 r0.225
  lines w0.05: -1.5,-1.225 -1.55,-1.225 -1.55,-1.025 -1.5,-1.025 ; -1.5,-0.775 -1.55,-0.775 -1.55,-0.575 -1.5,-0.575 ; -1.5,-0.325 -1.55,-0.325 -1.55,-0.125 -1.5,-0.125 ; -1.5,0.125 -1.55,0.125 -1.55,0.325 -1.5,0.325 ; -1.5,0.575 -1.55,0.575 -1.55,0.775 -1.5,0.775 ; -1.5,1.025 -1.55,1.025 -1.55,1.225 -1.5,1.225 ; 1.5,-1.225 1.55,-1.225 1.55,-1.025 1.5,-1.025 ; 1.5,-0.775 1.55,-0.775 1.55,-0.575 1.5,-0.575 ; 1.5,-0.325 1.55,-0.325 1.55,-0.125 1.5,-0.125 ; 1.5,0.125 1.55,0.125 1.55,0.325 1.5,0.325 ; 1.5,0.575 1.55,0.575 1.55,0.775 1.5,0.775 ; 1.5,1.025 1.55,1.025 1.55,1.225 1.5,1.225 ; -1.5,-1.5 -1.5,1.5 1.5,1.5 1.5,-1.5 -1.5,-1.5
  text ".Designator" at -3.443,-0.467 h2
Top Text:
  lines w0.05: -1.85,-1.8 1.85,-1.8 1.85,1.8 -1.85,1.8 -1.85,-1.8
  lines w0.1: -0.5,0 0.5,0 ; 0,-0.5 0,0.5
3D body "WDFN-12L.STEP": height 0.8, standoff 0, extent -1.55,-1.5 1.55,1.5